# Altium integrated library SMD-RCL.IntLib: 92 symbols
Pins are listed as number, name and electrical type; pins without a type are passive.

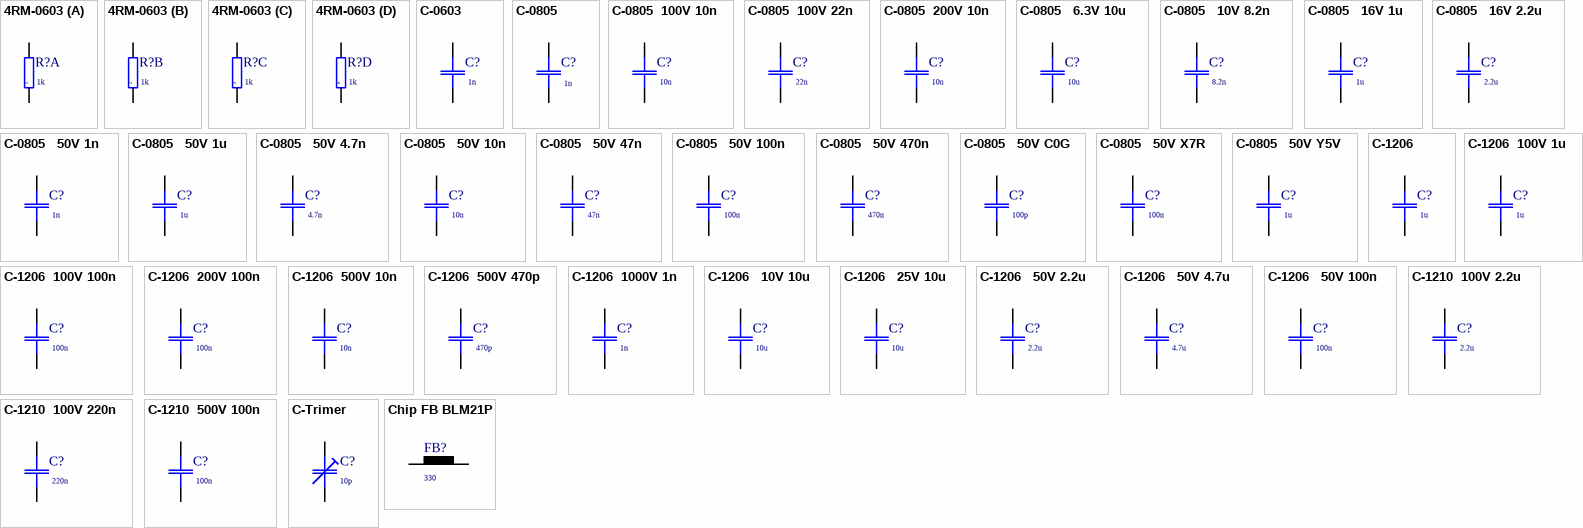
[diagram p0: symbols 4RM-0603 to Chip FB BLM21P]

## 4RM-0603
designator R?, comment 1k
SMD 4RM-0603 1\16W 5%; Price: 0.07; Value: 1k
footprint RM4x0603
simulation model RESISTOR (Model Description)
signal-integrity model Res (Model Description)
part A pins: 1, 8
part B pins: 2, 7
part C pins: 3, 6
part D pins: 4, 5
1 alternate drawing of the same symbol

## C-0603
designator C?, comment 1n
SMD-0603; Price: 0.014; Value: 1n
footprint C0603 ((1608) Metric)
simulation model Capacitor (Model Description)
signal-integrity model Cap (Model Description)
pins: 1, 2
1 alternate drawing of the same symbol

## C-0805
designator C?, comment 1n
SMD-0805; Price: 0.014; Value: 1n
footprint C0805(2013)
simulation model Capacitor (Model Description)
signal-integrity model Cap (Model Description)
pins: 1, 2
1 alternate drawing of the same symbol

## C-0805  100V 10n
designator C?, comment 10n
SMD-0805 100V X7R 10%; Price: 0.062; Value: 10n
footprint C0805(2013)
simulation model Capacitor (Model Description)
signal-integrity model Cap (Model Description)
pins: 1, 2
1 alternate drawing of the same symbol

## C-0805  100V 22n
designator C?, comment 22n
SMD-0805 100V X7R 10%; Price: 0.062; Value: 22n
footprint C0805(2013)
simulation model Capacitor (Model Description)
signal-integrity model Cap (Model Description)
pins: 1, 2
1 alternate drawing of the same symbol

## C-0805  200V 10n
designator C?, comment 10n
SMD-0805 200V Y5V +80/-20%; Price: 0.08; Value: 10n
footprint C0805(2013)
simulation model Capacitor (Model Description)
signal-integrity model Cap (Model Description)
pins: 1, 2
1 alternate drawing of the same symbol

## C-0805   6.3V 10u
designator C?, comment 10u
SMD-0805 6.3V Y5V +80/-20%; Price: 0.07; Value: 10u
footprint C0805(2013)
simulation model Capacitor (Model Description)
signal-integrity model Cap (Model Description)
pins: 1, 2
1 alternate drawing of the same symbol

## C-0805   10V 8.2n
designator C?, comment 8.2n
SMD-0805 10V Film; Price: 0.07; Value: 8.2n
footprint C0805(2013)
simulation model Capacitor (Model Description)
signal-integrity model Cap (Model Description)
pins: 1, 2
1 alternate drawing of the same symbol

## C-0805   16V 1u
designator C?, comment 1u
SMD-0805 16V X7R 10%; Price: 0.07; Value: 1u
footprint C0805(2013)
simulation model Capacitor (Model Description)
signal-integrity model Cap (Model Description)
pins: 1, 2
1 alternate drawing of the same symbol

## C-0805   16V 2.2u
designator C?, comment 2.2u
SMD-0805 16V Y5V +80/-20%; Price: 0.054; Value: 2.2u
footprint C0805(2013)
simulation model Capacitor (Model Description)
signal-integrity model Cap (Model Description)
pins: 1, 2
1 alternate drawing of the same symbol

## C-0805   50V 1n
designator C?, comment 1n
SMD-0805 50V C0G 5%; Price: 0.014; Value: 1n
footprint C0805(2013)
simulation model Capacitor (Model Description)
signal-integrity model Cap (Model Description)
pins: 1, 2
1 alternate drawing of the same symbol

## C-0805   50V 1u
designator C?, comment 1u
SMD-0805 50V Y5V +80/-20%; Price: 0.07; Value: 1u
footprint C0805(2013)
simulation model Capacitor (Model Description)
signal-integrity model Cap (Model Description)
pins: 1, 2
1 alternate drawing of the same symbol

## C-0805   50V 4.7n
designator C?, comment 4.7n
SMD-0805 50V X7R 10%; Price: 0.04; Value: 4.7n
footprint C0805(2013)
simulation model Capacitor (Model Description)
signal-integrity model Cap (Model Description)
pins: 1, 2
1 alternate drawing of the same symbol

## C-0805   50V 10n
designator C?, comment 10n
SMD-0805 50V X7R 10%; Price: 0.04; Value: 10n
footprint C0805(2013)
simulation model Capacitor (Model Description)
signal-integrity model Cap (Model Description)
pins: 1, 2
1 alternate drawing of the same symbol

## C-0805   50V 47n
designator C?, comment 47n
SMD-0805 50V Y5V +80/-20%; Price: 0.05; Value: 47n
footprint C0805(2013)
simulation model Capacitor (Model Description)
signal-integrity model Cap (Model Description)
pins: 1, 2
1 alternate drawing of the same symbol

## C-0805   50V 100n
designator C?, comment 100n
SMD-0805 50V Y5V +80/-20%; Price: 0.05; Value: 100n
footprint C0805(2013)
simulation model Capacitor (Model Description)
signal-integrity model Cap (Model Description)
pins: 1, 2
1 alternate drawing of the same symbol

## C-0805   50V 470n
designator C?, comment 470n
SMD-0805 50V Y5V +80/-20%; Price: 0.12; Value: 470n
footprint C0805(2013)
simulation model Capacitor (Model Description)
signal-integrity model Cap (Model Description)
pins: 1, 2
1 alternate drawing of the same symbol

## C-0805   50V C0G
designator C?, comment 100p
SMD-0805 50V C0G 5%; Price: 0.014; Value: 100p
footprint C0805(2013)
simulation model Capacitor (Model Description)
signal-integrity model Cap (Model Description)
pins: 1, 2
1 alternate drawing of the same symbol

## C-0805   50V X7R
designator C?, comment 100n
SMD-0805 50V X7R 10%; Price: 0.014; Value: 100n
footprint C0805(2013)
simulation model Capacitor (Model Description)
signal-integrity model Cap (Model Description)
pins: 1, 2
1 alternate drawing of the same symbol

## C-0805   50V Y5V
designator C?, comment 1u
SMD-0805 50V Y5V +80/-20%; Price: 0.014; Value: 1u
footprint C0805(2013)
simulation model Capacitor (Model Description)
signal-integrity model Cap (Model Description)
pins: 1, 2
1 alternate drawing of the same symbol

## C-1206
designator C?, comment 1u
SMD-1206; Price: 0.014; Value: 1u
footprint C1206(3216)
simulation model Capacitor (Model Description)
signal-integrity model Cap (Model Description)
pins: 1, 2
1 alternate drawing of the same symbol

## C-1206  100V 1u
designator C?, comment 1u
SMD-1206 100V X7R 10%; Price: 0.085; Value: 1u
footprint C1206(3216)
simulation model Capacitor (Model Description)
signal-integrity model Cap (Model Description)
pins: 1, 2
1 alternate drawing of the same symbol

## C-1206  100V 100n
designator C?, comment 100n
SMD-1206 100V X7R 10%; Price: 0.23; Value: 100n
footprint C1206(3216)
simulation model Capacitor (Model Description)
signal-integrity model Cap (Model Description)
pins: 1, 2
1 alternate drawing of the same symbol

## C-1206  200V 100n
designator C?, comment 100n
SMD-1206 200V X7R 10%; Price: 0.17; Value: 100n
footprint C1206(3216)
simulation model Capacitor (Model Description)
signal-integrity model Cap (Model Description)
pins: 1, 2
1 alternate drawing of the same symbol

## C-1206  500V 10n
designator C?, comment 10n
SMD-1206 500V X7R 10%; Price: 0.16; Value: 10n
footprint C1206(3216)
simulation model Capacitor (Model Description)
signal-integrity model Cap (Model Description)
pins: 1, 2
1 alternate drawing of the same symbol

## C-1206  500V 470p
designator C?, comment 470p
SMD-1206 500V C0G 10%; Price: 0.29; Value: 470p
footprint C1206(3216)
simulation model Capacitor (Model Description)
signal-integrity model Cap (Model Description)
pins: 1, 2
1 alternate drawing of the same symbol

## C-1206  1000V 1n
designator C?, comment 1n
SMD-1206 1000V X7R 10%; Price: 0.33; Value: 1n
footprint C1206(3216)
simulation model Capacitor (Model Description)
signal-integrity model Cap (Model Description)
pins: 1, 2
1 alternate drawing of the same symbol

## C-1206   10V 10u
designator C?, comment 10u
SMD-1206 10V Y5V +80/-20%; Price: 0.092; Value: 10u
footprint C1206(3216)
simulation model Capacitor (Model Description)
signal-integrity model Cap (Model Description)
pins: 1, 2
1 alternate drawing of the same symbol

## C-1206   25V 10u
designator C?, comment 10u
SMD-1206 25V X7R 10%; Price: 0.027; Value: 10u
footprint C1206(3216)
simulation model Capacitor (Model Description)
signal-integrity model Cap (Model Description)
pins: 1, 2
1 alternate drawing of the same symbol

## C-1206   50V 2.2u
designator C?, comment 2.2u
SMD-1206 50V X7R +10%; Price: 0.185; Value: 2.2u
footprint C1206(3216)
simulation model Capacitor (Model Description)
signal-integrity model Cap (Model Description)
pins: 1, 2
1 alternate drawing of the same symbol

## C-1206   50V 4.7u
designator C?, comment 4.7u
SMD-1206 50V X7R +10%; Price: 0.039; Value: 4.7u
footprint C1206(3216)
simulation model Capacitor (Model Description)
signal-integrity model Cap (Model Description)
pins: 1, 2
1 alternate drawing of the same symbol

## C-1206   50V 100n
designator C?, comment 100n
SMD-1206 50V Y5V +80/-20%; Price: 0.085; Value: 100n
footprint C1206(3216)
simulation model Capacitor (Model Description)
signal-integrity model Cap (Model Description)
pins: 1, 2
1 alternate drawing of the same symbol

## C-1210  100V 2.2u
designator C?, comment 2.2u
SMD-1210 100V X7R 10%; Price: 1; Value: 2.2u
footprint C1210(3225)
simulation model Capacitor (Model Description)
signal-integrity model Cap (Model Description)
pins: 1, 2
1 alternate drawing of the same symbol

## C-1210  100V 220n
designator C?, comment 220n
SMD-1210 100V X7R 10%; Price: 1; Value: 220n
footprint C1210(3225)
simulation model Capacitor (Model Description)
signal-integrity model Cap (Model Description)
pins: 1, 2
1 alternate drawing of the same symbol

## C-1210  500V 100n
designator C?, comment 100n
SMD-1210 500V X7R 10%; Price: 1; Value: 100n
footprint C1210(3225)
simulation model Capacitor (Model Description)
signal-integrity model Cap (Model Description)
pins: 1, 2
1 alternate drawing of the same symbol

## C-Trimer
designator C?, comment 10p
Price: 0.4; Value: 10p
footprint Ctr-SMD3
simulation model Capacitor (Model Description)
signal-integrity model Cap (Model Description)
pins: 1, 2
1 alternate drawing of the same symbol

## Chip FB BLM21P
designator FB?, comment 330
0805 1.5A 0.09ohm; Value: 0.51u; Price: 0.05
footprint FB0805
simulation model Model Name (Model Description)
signal-integrity model L (Model Description)
pins: 1, 2
1 alternate drawing of the same symbol

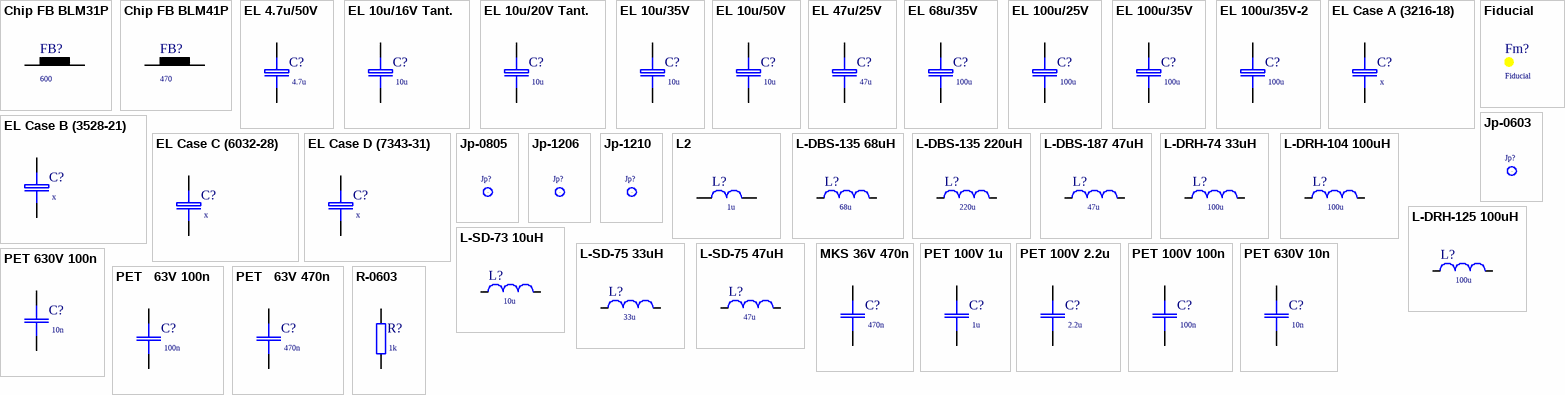
[diagram p1: symbols Chip FB BLM31P to R-0603]

## Chip FB BLM31P
designator FB?, comment 600
1206 1.5A 0.08ohm; Value: 1u; Price: 0.16
footprint FB1206
simulation model Model Name (Model Description)
signal-integrity model L (Model Description)
pins: 1, 2
1 alternate drawing of the same symbol

## Chip FB BLM41P
designator FB?, comment 470
1806 2A 0.05ohm; Value: 0.75u; Price: 0.28
footprint FB1806
simulation model Model Name (Model Description)
signal-integrity model L (Model Description)
pins: 1, 2
1 alternate drawing of the same symbol

## EL 4.7u/50V
designator C?, comment 4.7u
EL 50V SMD Case C D5x5.3 h5.4; Price: 0.014; Value: 4.7u
footprint EL SMD Case C D5x5.3 h5.4(0505)
simulation model Capacitor (Model Description)
signal-integrity model Cap (Model Description)
pins: 1 +, 2 -
1 alternate drawing of the same symbol

## EL 10u/16V Tant.
designator C?, comment 10u
El Case A (2012-12); Price: 0.22; Value: 10u
footprint EL Case A (3216-18) (Capacitor, SM Tantalum; Body 3.2 x 1.6 mm (LxW typ))
simulation model Capacitor (Model Description)
signal-integrity model Cap (Model Description)
pins: 1 +, 2 -
1 alternate drawing of the same symbol

## EL 10u/20V Tant.
designator C?, comment 10u
Case B (3528-21); Price: 0.22; Value: 10u
footprint EL Case B (3528-21) (Capacitor, SM Tantalum; Body 3.5 x 2.8 mm (LxW typ))
simulation model Capacitor (Model Description)
signal-integrity model Cap (Model Description)
pins: 1 +, 2 -
1 alternate drawing of the same symbol

## EL 10u/35V
designator C?, comment 10u
EL 35V SMD Case C D5x5.3 h5.4; Price: 0.014; Value: 10u
footprint EL SMD Case C D5x5.3 h5.4(0505)
simulation model Capacitor (Model Description)
signal-integrity model Cap (Model Description)
pins: 1 +, 2 -
1 alternate drawing of the same symbol

## EL 10u/50V
designator C?, comment 10u
EL 50V SMD Case C D5x5.3 h5.4; Price: 0.014; Value: 10u
footprint EL SMD Case C D5x5.3 h5.4(0505)
simulation model Capacitor (Model Description)
signal-integrity model Cap (Model Description)
pins: 1 +, 2 -
1 alternate drawing of the same symbol

## EL 47u/25V
designator C?, comment 47u
EL Tantalum 25V SMD Case E; Price: 0.014; Value: 47u
footprint EL Case E (7343-43) (Capacitor, SM Tantalum; Body 7.3 x 4.3 mm (LxW typ))
simulation model Capacitor (Model Description)
signal-integrity model Cap (Model Description)
pins: 1 +, 2 -
1 alternate drawing of the same symbol

## EL 68u/35V
designator C?, comment 100u
EL 35V SMD Case D D6.3x6.6 h7.7(0605); Price: 0.014; Value: 100u
footprint EL SMD Case D D6.3x6.6 h7.7(0605)
simulation model Capacitor (Model Description)
signal-integrity model Cap (Model Description)
pins: 1 +, 2 -
1 alternate drawing of the same symbol

## EL 100u/25V
designator C?, comment 100u
EL 25V SMD Case C D6.3x6.6 h7.7; Price: 0.014; Value: 100u
footprint EL SMD Case D D6.3x6.6 h7.7(0605)
simulation model Capacitor (Model Description)
signal-integrity model Cap (Model Description)
pins: 1 +, 2 -
1 alternate drawing of the same symbol

## EL 100u/35V
designator C?, comment 100u
EL 35V SMD Case G D10x10.3h10.5; Price: 0.014; Value: 100u
footprint EL SMD Case G D10x10.3 h10.2(1010)
simulation model Capacitor (Model Description)
signal-integrity model Cap (Model Description)
pins: 1 +, 2 -
1 alternate drawing of the same symbol

## EL 100u/35V-2
designator C?, comment 100u
EL 35V SMD Case D D6.3x6.6 h7.7(0605); Price: 0.014; Value: 100u
footprint EL SMD Case D D6.3x6.6 h7.7(0605)
simulation model Capacitor (Model Description)
signal-integrity model Cap (Model Description)
pins: 1 +, 2 -
1 alternate drawing of the same symbol

## EL Case A (3216-18)
designator C?, comment x
EL Tantalum Case A (3216-18); Price: 0.46; Value: x
footprint EL Case A (3216-18) (Capacitor, SM Tantalum; Body 3.2 x 1.6 mm (LxW typ))
simulation model Capacitor (Model Description)
signal-integrity model Cap (Model Description)
pins: 1 +, 2 -
1 alternate drawing of the same symbol

## EL Case B (3528-21)
designator C?, comment x
EL Tantalum Case B (3528-21); Price: 0.22; Value: x
footprint EL Case B (3528-21) (Capacitor, SM Tantalum; Body 3.5 x 2.8 mm (LxW typ))
simulation model Capacitor (Model Description)
signal-integrity model Cap (Model Description)
pins: 1 +, 2 -
1 alternate drawing of the same symbol

## EL Case C (6032-28)
designator C?, comment x
EL Tantalum Case C (6032-28); Price: 0.41; Value: x
footprint EL Case C (6032-28) (Capacitor, SM Tantalum; Body 6.0 x 3.2 mm (LxW typ))
simulation model Capacitor (Model Description)
signal-integrity model Cap (Model Description)
pins: 1 +, 2 -
1 alternate drawing of the same symbol

## EL Case D (7343-31)
designator C?, comment x
EL Tantalum Case D (7343-31); Price: 0.60; Value: x
footprint EL Case D (7343-31) (Capacitor, SM Tantalum; Body 7.3 x 4.3 mm (LxW typ))
simulation model Capacitor (Model Description)
signal-integrity model Cap (Model Description)
pins: 1 +, 2 -
1 alternate drawing of the same symbol

## Fiducial
designator Fm?  (no BOM)
footprint Fiducial (Footprint not found)

## Jp-0603
designator Jp?, comment 0  (value not drawn)
SMD-0603 0-om
footprint J-0603
pins: 1 A, 2 B
2 alternate drawings of the same symbol

## Jp-0805
designator Jp?, comment 0  (value not drawn)
SMD-0805 0-om; Price: 0.017
footprint J-0805
pins: 1 A, 2 B
2 alternate drawings of the same symbol

## Jp-1206
designator Jp?, comment 0  (value not drawn)
SMD-1206-om; Price: 0.045
footprint J-1206
pins: 1 A, 2 B
2 alternate drawings of the same symbol

## Jp-1210
designator Jp?, comment 0  (value not drawn)
SMD-1210-om; Price: 0.05
footprint J-1210
pins: 1 A, 2 B
2 alternate drawings of the same symbol

## L2
designator L?, comment 1u
Price: 0.2; Value: 1u
footprint L0805
simulation model Model Name (Model Description)
signal-integrity model L (Model Description)
pins: 1, 2
1 alternate drawing of the same symbol

## L-DBS-135 68uH
designator L?, comment 68u
1.5A 0.2om 12.8x9.3x5.4mm; Price: 0.73; Value: 68u
footprint Dr-DBS-135
simulation model Inductor (Model Description)
signal-integrity model L (Model Description)
pins: 1, 2
1 alternate drawing of the same symbol

## L-DBS-135 220uH
designator L?, comment 220u
0.8A 0.61om; Price: 0.73; Value: 220u
footprint Dr-DBS-135
simulation model Inductor (Model Description)
signal-integrity model L (Model Description)
pins: 1, 2
1 alternate drawing of the same symbol

## L-DBS-187 47uH
designator L?, comment 47u
5A 0.086om 18.5x14.5x7.3mm; Price: 0.84; Value: 47u
footprint Dr-DBS-187
simulation model Inductor (Model Description)
signal-integrity model L (Model Description)
pins: 1, 2
1 alternate drawing of the same symbol

## L-DRH-74 33uH
designator L?, comment 100u
1.05A 0.17ohm; Price: 0.73; Value: 100u
footprint Dr-DRH-74
simulation model Inductor (Model Description)
signal-integrity model L (Model Description)
pins: 1, 2
1 alternate drawing of the same symbol

## L-DRH-104 100uH
designator L?, comment 100u
1.36A 0.27ohm 10x10x3.8mm; Price: 0.73; Value: 100u
footprint Dr-DRH-104
simulation model Inductor (Model Description)
signal-integrity model L (Model Description)
pins: 1, 2
1 alternate drawing of the same symbol

## L-DRH-125 100uH
designator L?, comment 100u
1.3A 7mohm 12x12x6mm; Price: 0.73; Value: 100u
footprint Dr-DRH-125 (SIR1205) (Footprint not found)
simulation model Inductor (Model Description)
signal-integrity model L (Model Description)
pins: 1, 2
1 alternate drawing of the same symbol

## L-SD-73 10uH
designator L?, comment 10u
2.1A 0.08om 7x7x3.2mm; Price: 0.85; Value: 10u
footprint Dr-SD-73 (7x7x3.2mm)
simulation model Inductor (Model Description)
signal-integrity model L (Model Description)
pins: 1, 2
1 alternate drawing of the same symbol

## L-SD-75 33uH
designator L?, comment 33u
1.2A 0.15om 7.3x7.3x5mm; Price: 0.85; Value: 33u
footprint Dr-SD-75
simulation model Inductor (Model Description)
signal-integrity model L (Model Description)
pins: 1, 2
1 alternate drawing of the same symbol

## L-SD-75 47uH
designator L?, comment 47u
1A 0.18om 7.3x7.3x5mm; Price: 0.85; Value: 47u
footprint Dr-SD-75
simulation model Inductor (Model Description)
signal-integrity model L (Model Description)
pins: 1, 2
1 alternate drawing of the same symbol

## MKS 36V 470n
designator C?, comment 470n
SMD-2824 36V; Price: 1.75; Value: 470n
footprint C2824
simulation model Capacitor (Model Description)
signal-integrity model Cap (Model Description)
pins: 1, 2
1 alternate drawing of the same symbol

## PET 100V 1u
designator C?, comment 1u
WIMA SMD-PET-2824 100V; Price: *; Value: 1u
footprint C2824
simulation model Capacitor (Model Description)
signal-integrity model Cap (Model Description)
pins: 1, 2
1 alternate drawing of the same symbol

## PET 100V 2.2u
designator C?, comment 2.2u
WIMA SMD-PET-2824 100V; Price: *; Value: 2.2u
footprint C2824
simulation model Capacitor (Model Description)
signal-integrity model Cap (Model Description)
pins: 1, 2
1 alternate drawing of the same symbol

## PET 100V 100n
designator C?, comment 100n
WIMA SMD-PET-2220 100V; Price: 0.65; Value: 100n
footprint C2220 ((5750) Metric)
simulation model Capacitor (Model Description)
signal-integrity model Cap (Model Description)
pins: 1, 2
1 alternate drawing of the same symbol

## PET 630V 10n
designator C?, comment 10n
WIMA SMD-PET- 4030 630V; Price: *; Value: 10n
footprint C4030
simulation model Capacitor (Model Description)
signal-integrity model Cap (Model Description)
pins: 1, 2
1 alternate drawing of the same symbol

## PET 630V 100n
designator C?, comment 10n
WIMA SMD-PET- 6054 630V; Price: 1; Value: 10n
footprint C6054
simulation model Capacitor (Model Description)
signal-integrity model Cap (Model Description)
pins: 1, 2
1 alternate drawing of the same symbol

## PET   63V 100n
designator C?, comment 100n
WIMA SMD-PET-2824 63V; Price: 0.63; Value: 100n
footprint C2824
simulation model Capacitor (Model Description)
signal-integrity model Cap (Model Description)
pins: 1, 2
1 alternate drawing of the same symbol

## PET   63V 470n
designator C?, comment 470n
WIMA SMD-PET-2824 63V; Price: 1.72; Value: 470n
footprint C2824
simulation model Capacitor (Model Description)
signal-integrity model Cap (Model Description)
pins: 1, 2
1 alternate drawing of the same symbol

## R-0603
designator R?, comment 1k
SMD 0603 0.0625W 5% 50V; Price: 0.017; Value: 1k
footprint R0603
simulation model Resistor (Model Description)
signal-integrity model Res (Model Description)
pins: 1, 2
1 alternate drawing of the same symbol

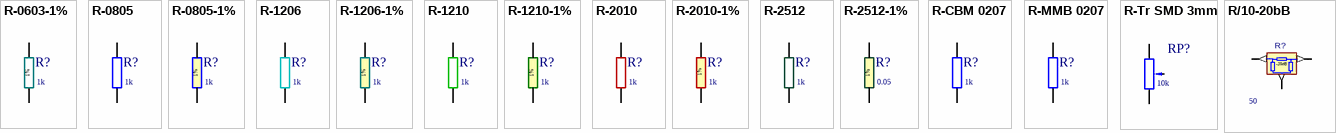
[diagram p2: symbols R-0603-1% to R/10-20bB]

## R-0603-1%
designator R?, comment 1k
SMD 0603 0.0625W 1% 50V; Price: 0.017; Value: 1k
footprint R0603-1%
simulation model Resistor (Model Description)
signal-integrity model Res (Model Description)
pins: 1, 2
1 alternate drawing of the same symbol
text: 1%

## R-0805
designator R?, comment 1k
SMD 0805 0.1W 5% 150V; Price: 0.017; Value: 1k
footprint R0805
simulation model Resistor (Model Description)
signal-integrity model Res (Model Description)
pins: 1, 2
1 alternate drawing of the same symbol

## R-0805-1%
designator R?, comment 1k
SMD 0805 0.1W 1% 150V; Price: 0.034; Value: 1k
footprint R0805-1%
simulation model Resistor (Model Description)
signal-integrity model Res (Model Description)
pins: 1, 2
1 alternate drawing of the same symbol
text: 1%

## R-1206
designator R?, comment 1k
SMD 1206 0.125W 5% 200V; Price: 0.045; Value: 1k
footprint R1206
simulation model Resistor (Model Description)
signal-integrity model Res (Model Description)
pins: 1, 2
1 alternate drawing of the same symbol

## R-1206-1%
designator R?, comment 1k
SMD 1206 0.125W 1% 200V; Price: 0.051; Value: 1k
footprint R1206-1%
simulation model Resistor (Model Description)
signal-integrity model Res (Model Description)
pins: 1, 2
1 alternate drawing of the same symbol
text: 1%

## R-1210
designator R?, comment 1k
SMD 1210 0.25W 5% 200V; Price: 0.045; Value: 1k
footprint R1210
simulation model Resistor (Model Description)
signal-integrity model R (Model Description)
pins: 1, 2
1 alternate drawing of the same symbol

## R-1210-1%
designator R?, comment 1k
SMD 1210 0.25W 1% 200V; Price: 0.045; Value: 1k
footprint R1210-1%
simulation model Resistor (Model Description)
signal-integrity model R (Model Description)
pins: 1, 2
1 alternate drawing of the same symbol
text: 1%

## R-2010
designator R?, comment 1k
SMD 2512 0.5W 5% 200V; Price: 0.00504; Value: 1k
footprint R2010
simulation model Resistor (Model Description)
signal-integrity model R (Model Description)
pins: 1, 2
1 alternate drawing of the same symbol

## R-2010-1%
designator R?, comment 1k
SMD 2512 0.5W 5% 200V; Price: 0.17; Value: 1k
footprint R2010
simulation model Resistor (Model Description)
signal-integrity model R (Model Description)
pins: 1, 2
1 alternate drawing of the same symbol
text: 1%

## R-2512
designator R?, comment 1k
SMD 2512 1W 5% 200V; Price: 0.087; Value: 1k
footprint R2512
simulation model Resistor (Model Description)
signal-integrity model R (Model Description)
pins: 1, 2
1 alternate drawing of the same symbol

## R-2512-1%
designator R?, comment 0.05
SMD 2512 1W 1% 200V; Price: 0.288; Value: 0.05
footprint R2512-1%
simulation model Resistor (Model Description)
signal-integrity model Res (Model Description)
pins: 1, 2
1 alternate drawing of the same symbol
text: 1%

## R-CBM 0207
designator R?, comment 1k
High Pulse Load Carbon Film CBM 0207 500V 0.4W; Price: 0.017; Value: 1k
footprint Melf 0207 (Metal Electrode Face (MELF) Diode; Body 5 x 2.5 mm (LxDia))
simulation model Resistor (Model Description)
signal-integrity model Res (Model Description)
pins: 1, 2
1 alternate drawing of the same symbol

## R-MMB 0207
designator R?, comment 1k
MMB 0207 300V 0.4W; Price: 0.017; Value: 1k
footprint Melf 0207 (Metal Electrode Face (MELF) Diode; Body 5 x 2.5 mm (LxDia))
simulation model Resistor (Model Description)
signal-integrity model Res (Model Description)
pins: 1, 2
1 alternate drawing of the same symbol

## R-Tr SMD 3mm
designator RP?, comment 10k
Set Position: 0.5; Price: 0.2; Value: 10k
footprint Rtr-SMD3
simulation model Pot (Potentiometer)
signal-integrity model Pot
pins: 1, 2, 3
1 alternate drawing of the same symbol

## R/10-20bB
designator R?, comment 50
Price: 10; Value: 50
footprint R-Att D10AAxxZ4
pins: 1 In/Out (out), 2 In/Out (out), 3 G (out)
1 alternate drawing of the same symbol
text: -20dB